# Altium footprint library Common Components.PcbLib: 94 footprints (part 4 of 6)
Each footprint in its own frame and in the unit in brackets; x right, y up, seen from the top. Pads: shape width x height; smd on the part's side, far side on the other; paste and mask are expansions set on the pad; w line width, h text height; cw(c..) or ccw(c..) is an arc to the next point about the centre after c.
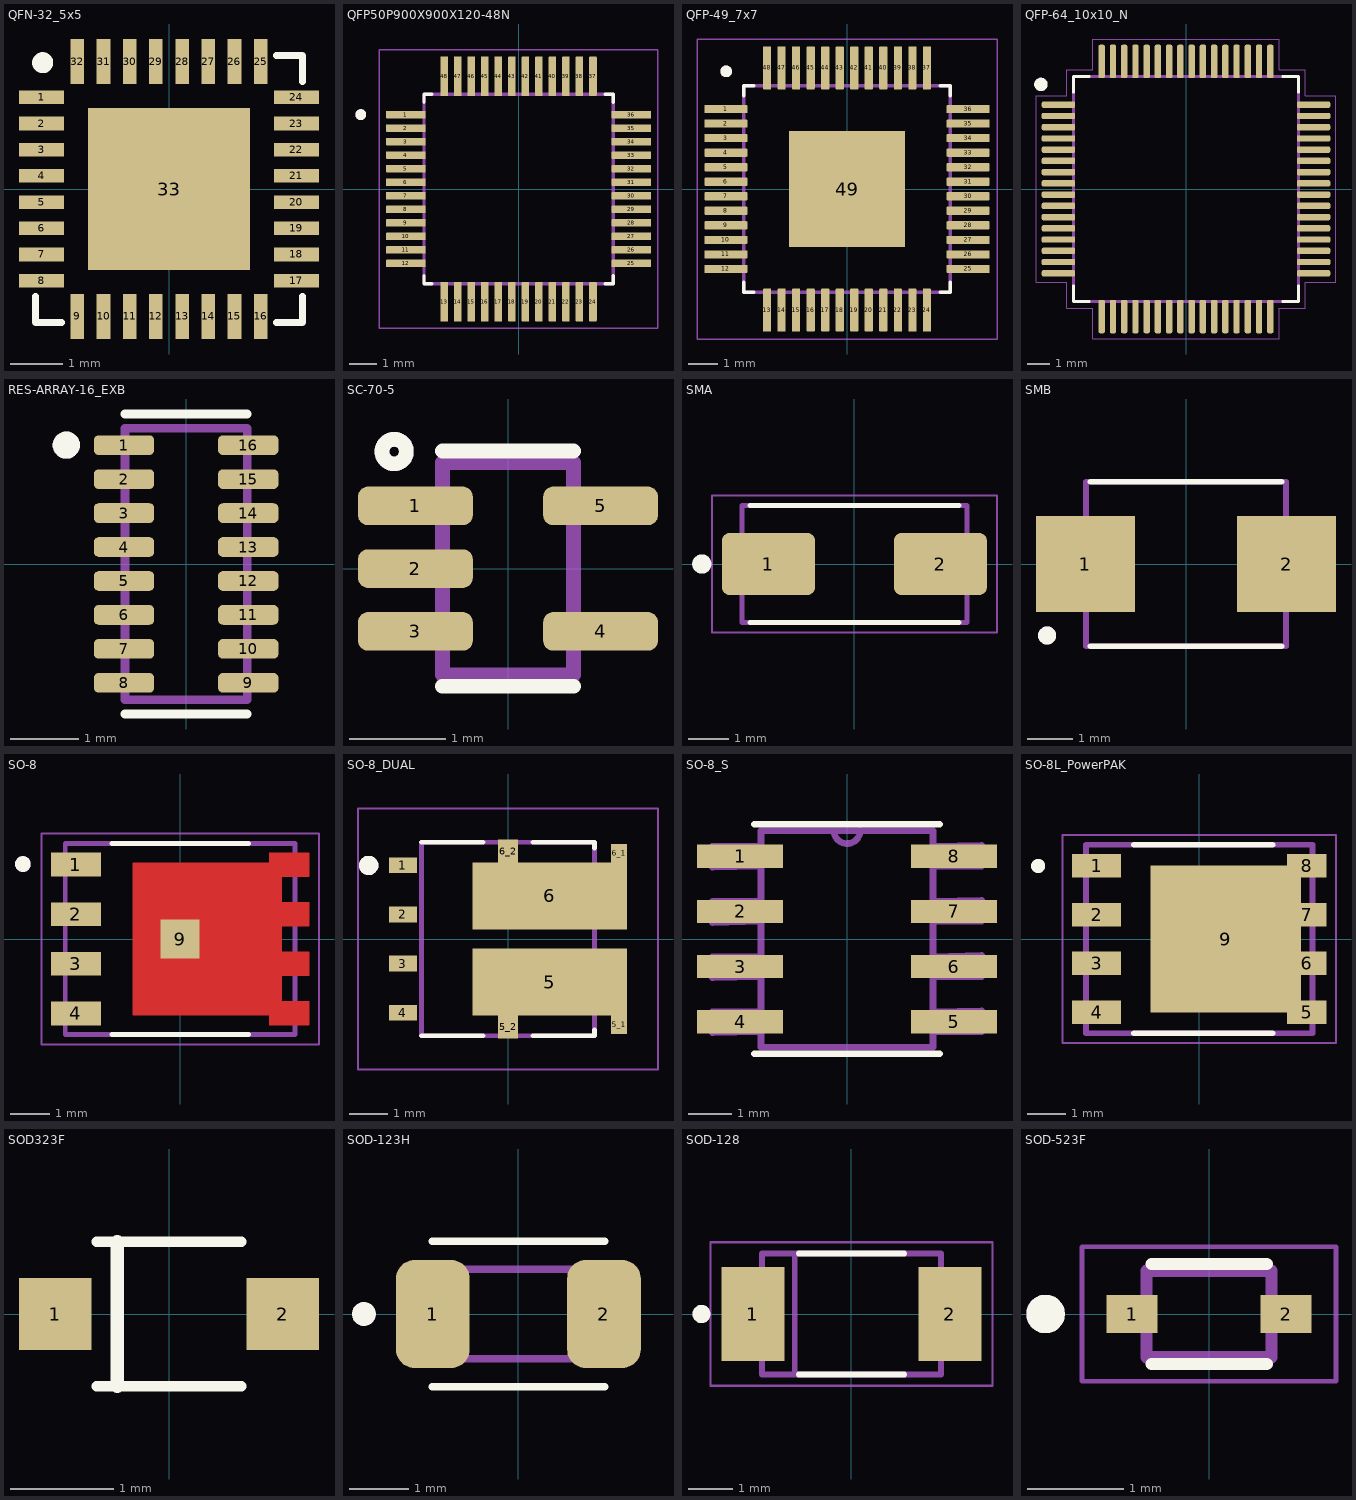
[diagram p3: the footprints below, top view; thin cyan lines are the x and y axes]

## QFN-32_5x5 [mm]
pads (33):
  rect 0.86x0.26 smd mask+0.051: 1(-2.435,1.75) 2(-2.435,1.25) 3(-2.435,0.75) 4(-2.435,0.25) 5(-2.435,-0.25) 6(-2.435,-0.75) 7(-2.435,-1.25) 8(-2.435,-1.75) 17(2.435,-1.75) 18(2.435,-1.25) 19(2.435,-0.75) 20(2.435,-0.25) 21(2.435,0.25) 22(2.435,0.75) 23(2.435,1.25) 24(2.435,1.75)
  rect 0.26x0.86 smd mask+0.051: 9(-1.75,-2.435) 10(-1.25,-2.435) 11(-0.75,-2.435) 12(-0.25,-2.435) 13(0.25,-2.435) 14(0.75,-2.435) 15(1.25,-2.435) 16(1.75,-2.435) 25(1.75,2.435) 26(1.25,2.435) 27(0.75,2.435) 28(0.25,2.435) 29(-0.25,2.435) 30(-0.75,2.435) 31(-1.25,2.435) 32(-1.75,2.435)
  rect 3.1x3.1 smd: 33(0,0)
Top Overlay:
  circle w0.2: c-2.413,2.413 r0.1
  lines w0.127: -2.55,-2.05 -2.55,-2.55 -2.05,-2.55 ; 2.05,-2.55 2.55,-2.55 2.55,-2.05 ; 2.05,2.55 2.55,2.55 2.55,2.05
Top Paste:
  region: -0.981,0.98 0.98,0.98 0.98,-0.981 -0.981,-0.981
3D body "QFN-32_5x5.step": height 0.8, standoff 0, extent -2.51,-2.51 2.51,2.51

## QFP50P900X900X120-48N [mm]
pads (48):
  rrect25% 1.47x0.28 smd: 1(-4.17,2.75) 2(-4.17,2.25) 3(-4.17,1.75) 4(-4.17,1.25) 5(-4.17,0.75) 6(-4.17,0.25) 7(-4.17,-0.25) 8(-4.17,-0.75) 9(-4.17,-1.25) 10(-4.17,-1.75) 11(-4.17,-2.25) 12(-4.17,-2.75) 25(4.17,-2.75) 26(4.17,-2.25) 27(4.17,-1.75) 28(4.17,-1.25) 29(4.17,-0.75) 30(4.17,-0.25) 31(4.17,0.25) 32(4.17,0.75) 33(4.17,1.25) 34(4.17,1.75) 35(4.17,2.25) 36(4.17,2.75)
  rrect25% 0.28x1.47 smd: 13(-2.75,-4.17) 14(-2.25,-4.17) 15(-1.75,-4.17) 16(-1.25,-4.17) 17(-0.75,-4.17) 18(-0.25,-4.17) 19(0.25,-4.17) 20(0.75,-4.17) 21(1.25,-4.17) 22(1.75,-4.17) 23(2.25,-4.17) 24(2.75,-4.17) 37(2.75,4.17) 38(2.25,4.17) 39(1.75,4.17) 40(1.25,4.17) 41(0.75,4.17) 42(0.25,4.17) 43(-0.25,4.17) 44(-0.75,4.17) 45(-1.25,4.17) 46(-1.75,4.17) 47(-2.25,4.17) 48(-2.75,4.17)
Top Overlay:
  circle w0.2: c-5.84,2.75 r0.1
  lines w0.127: -3.5,-3.21 -3.5,-3.5 -3.21,-3.5 ; -3.5,3.21 -3.5,3.5 -3.21,3.5 ; 3.21,-3.5 3.5,-3.5 3.5,-3.21 ; 3.21,3.5 3.5,3.5 3.5,3.21
Mechanical 13:
  circle w0.2: c-5.84,2.75 r0.1
  lines w0.127: -3.5,-3.5 3.5,-3.5 3.5,3.5 -3.5,3.5 -3.5,-3.5
Mechanical 15:
  lines w0.05: -5.155,-5.155 5.155,-5.155 5.155,5.155 -5.155,5.155 -5.155,-5.155
3D body "TQFP48.step": height 1.01, standoff -0.01, extent -4.5,-4.5 4.509,4.5

## QFP-49_7x7 [mm]
pads (49):
  rrect25% 1.49x0.28 smd: 1(-4.17,2.75) 2(-4.17,2.25) 3(-4.17,1.75) 4(-4.17,1.25) 5(-4.17,0.75) 6(-4.17,0.25) 7(-4.17,-0.25) 8(-4.17,-0.75) 9(-4.17,-1.25) 10(-4.17,-1.75) 11(-4.17,-2.25) 12(-4.17,-2.75) 25(4.17,-2.75) 26(4.17,-2.25) 27(4.17,-1.75) 28(4.17,-1.25) 29(4.17,-0.75) 30(4.17,-0.25) 31(4.17,0.25) 32(4.17,0.75) 33(4.17,1.25) 34(4.17,1.75) 35(4.17,2.25) 36(4.17,2.75)
  rrect25% 0.28x1.49 smd: 13(-2.75,-4.17) 14(-2.25,-4.17) 15(-1.75,-4.17) 16(-1.25,-4.17) 17(-0.75,-4.17) 18(-0.25,-4.17) 19(0.25,-4.17) 20(0.75,-4.17) 21(1.25,-4.17) 22(1.75,-4.17) 23(2.25,-4.17) 24(2.75,-4.17) 37(2.75,4.17) 38(2.25,4.17) 39(1.75,4.17) 40(1.25,4.17) 41(0.75,4.17) 42(0.25,4.17) 43(-0.25,4.17) 44(-0.75,4.17) 45(-1.25,4.17) 46(-1.75,4.17) 47(-2.25,4.17) 48(-2.75,4.17)
  rect 4x4 smd paste-3: 49(0,0)
Top Overlay:
  circle w0.2: c-4.16,4.05 r0.1
  lines w0.127: -3.55,-3.21 -3.55,-3.55 -3.21,-3.55 ; -3.55,3.21 -3.55,3.55 -3.21,3.55 ; 3.21,-3.55 3.55,-3.55 3.55,-3.21 ; 3.21,3.55 3.55,3.55 3.55,3.21
Top Paste:
  region: 1.63,-1.63 0.37,-1.63 0.37,-0.37 1.63,-0.37
  region: -0.37,-1.63 -1.63,-1.63 -1.63,-0.37 -0.37,-0.37
  region: 1.63,0.37 0.37,0.37 0.37,1.63 1.63,1.63
  region: -0.37,0.37 -1.63,0.37 -1.63,1.63 -0.37,1.63
Mechanical 13:
  circle w0.2: c-4.16,4.05 r0.1
  lines w0.127: -3.55,-3.55 -3.55,3.55 3.55,3.55 3.55,-3.55 -3.55,-3.55
Mechanical 15:
  lines w0.05: -5.165,-5.165 -5.165,5.165 5.165,5.165 5.165,-5.165 -5.165,-5.165
3D body "step_temp.STEP": height 1.18, standoff -0.02, extent -4.496,-4.5 4.504,4.5

## QFP-64_10x10_N [mm]
pads (64):
  rrect50% 1.49x0.28 smd: 1(-5.67,3.75) 2(-5.67,3.25) 3(-5.67,2.75) 4(-5.67,2.25) 5(-5.67,1.75) 6(-5.67,1.25) 7(-5.67,0.75) 8(-5.67,0.25) 9(-5.67,-0.25) 10(-5.67,-0.75) 11(-5.67,-1.25) 12(-5.67,-1.75) 13(-5.67,-2.25) 14(-5.67,-2.75) 15(-5.67,-3.25) 16(-5.67,-3.75) 33(5.67,-3.75) 34(5.67,-3.25) 35(5.67,-2.75) 36(5.67,-2.25) 37(5.67,-1.75) 38(5.67,-1.25) 39(5.67,-0.75) 40(5.67,-0.25) 41(5.67,0.25) 42(5.67,0.75) 43(5.67,1.25) 44(5.67,1.75) 45(5.67,2.25) 46(5.67,2.75) 47(5.67,3.25) 48(5.67,3.75)
  rrect50% 0.28x1.49 smd: 17(-3.75,-5.67) 18(-3.25,-5.67) 19(-2.75,-5.67) 20(-2.25,-5.67) 21(-1.75,-5.67) 22(-1.25,-5.67) 23(-0.75,-5.67) 24(-0.25,-5.67) 25(0.25,-5.67) 26(0.75,-5.67) 27(1.25,-5.67) 28(1.75,-5.67) 29(2.25,-5.67) 30(2.75,-5.67) 31(3.25,-5.67) 32(3.75,-5.67) 49(3.75,5.67) 50(3.25,5.67) 51(2.75,5.67) 52(2.25,5.67) 53(1.75,5.67) 54(1.25,5.67) 55(0.75,5.67) 56(0.25,5.67) 57(-0.25,5.67) 58(-0.75,5.67) 59(-1.25,5.67) 60(-1.75,5.67) 61(-2.25,5.67) 62(-2.75,5.67) 63(-3.25,5.67) 64(-3.75,5.67)
Top Overlay:
  circle w0.3: c-6.45,4.65 r0.15
  circle w0.3: c-6.45,4.65 r0.15
  circle w0.127: c-6.45,4.65 r0.05
  lines w0.127: -5,-4.3 -5,-5 -4.3,-5 ; -5,4.3 -5,5 -4.3,5 ; 4.3,-5 5,-5 5,-4.3 ; 4.3,5 5,5 5,4.3
Mechanical 13:
  lines w0.127: -5,-5 -5,5 5,5 5,-5 -5,-5
Mechanical 15:
  lines w0.05: -6.67,-4.14 -6.67,4.14 -5.3,4.14 -5.3,5.3 -4.14,5.3 -4.14,6.67 4.14,6.67 4.14,5.3 5.3,5.3 5.3,4.14 6.67,4.14 6.67,-4.14 5.3,-4.14 5.3,-5.3 4.14,-5.3 4.14,-6.67 -4.14,-6.67 -4.14,-5.3 -5.3,-5.3 -5.3,-4.14 -6.67,-4.14
3D body "QFP-64_10x10.STEP": height 1.57, standoff -0.03, extent -6,-6 6,6

## RES-ARRAY-16_EXB [mm]
pads (16):
  rrect50% 0.89x0.29 smd paste+0 mask+0.127: 1(-0.915,1.75) 2(-0.915,1.25) 3(-0.915,0.75) 4(-0.915,0.25) 5(-0.915,-0.25) 6(-0.915,-0.75) 7(-0.915,-1.25) 8(-0.915,-1.75) 9(0.915,-1.75) 10(0.915,-1.25) 11(0.915,-0.75) 12(0.915,-0.25) 13(0.915,0.25) 14(0.915,0.75) 15(0.915,1.25) 16(0.915,1.75)
Top Overlay:
  circle w0.2: c-1.765,1.75 r0.1
  lines w0.127: -0.9,-2.209 0.9,-2.209 ; -0.9,2.209 0.9,2.209
Mechanical 13:
  circle w0.2: c-1.765,1.75 r0.1
  lines w0.127: -0.9,-2 -0.9,2 0.9,2 0.9,-2 -0.9,-2
3D body "RES_ARRAY-16_EXB.STEP": height 0.55, standoff 0, extent -0.9,-1.95 0.9,1.95

## SC-70-5 [mm]
pads (5):
  rrect50% 1.19x0.4 smd mask+0.178: 1(-0.96,0.65) 2(-0.96,0) 3(-0.96,-0.65) 4(0.96,-0.65) 5(0.96,0.65)
Top Overlay:
  lines w0.152: -0.68,-1.219 0.68,-1.219 ; -0.68,1.219 0.68,1.219 ; -1.18,1.087 cw(c-1.18,1.214) -1.18,1.341 cw(c-1.18,1.214) -1.18,1.087
Mechanical 13:
  lines w0.152: -1.18,1.087 cw(c-1.18,1.214) -1.18,1.341 cw(c-1.18,1.214) -1.18,1.087 ; -0.68,-1.1 -0.68,1.1 0.68,1.1 0.68,-1.1 -0.68,-1.1
3D body "SC70-5.step": height 0.95, standoff 0, extent -1.05,-1 1.05,1

## SMA [mm]
pads (2):
  rrect25% 2.32x1.55 smd: 1(-2.14,0) 2(2.14,0)
Top Overlay:
  circle w0.24: c-3.8,0 r0.12
  lines w0.127: -2.605,-1.46 2.605,-1.46 ; -2.605,1.46 2.605,1.46
Mechanical 13:
  lines w0.127: -2.8,-1.46 2.8,-1.46 2.8,1.46 -2.8,1.46 -2.8,-1.46
Mechanical 15:
  lines w0.05: -3.55,-1.71 -3.55,1.71 3.55,1.71 3.55,-1.71 -3.55,-1.71
3D body "SMA.step": height 2.15, standoff -0.05, extent -2.5,-1.35 2.5,1.35

## SMB [mm]
pads (2):
  rect 2.18x2.12 smd: 1(-2.215,0) 2(2.215,0)
Top Overlay:
  circle w0.2: c-3.061,-1.575 r0.1
  lines w0.127: -2.103,-1.81 2.103,-1.81 ; -2.103,1.81 2.103,1.81
Mechanical 13:
  circle w0.2: c-3.061,-1.575 r0.1
  lines w0.127: -2.203,-1.81 2.203,-1.81 2.203,1.81 -2.203,1.81 -2.203,-1.81
3D body "SMB.step": height 2.45, standoff 0.03, extent -2.75,-1.95 2.75,1.95

## SO-8 [mm]
pads (5):
  rect 1.27x0.61 smd: 1(-2.67,1.905) 2(-2.67,0.635) 3(-2.67,-0.635) 4(-2.67,-1.905)
  rect 1x1 smd paste-1 mask+0: 9(0,0)
Top Layer:
  region: 3.305,1.6 2.595,1.6 2.595,0.94 3.305,0.94 3.305,0.33 2.595,0.33 2.595,-0.33 3.305,-0.33 3.305,-0.94 2.595,-0.94 2.595,-1.6 3.305,-1.6 3.305,-2.21 2.285,-2.21 2.285,-1.955 -1.215,-1.955 -1.215,1.955 2.285,1.955 2.285,2.21 3.305,2.21
Top Overlay:
  circle w0.2: c-4.03,1.92 r0.1
  lines w0.127: -1.75,-2.45 1.75,-2.45 ; -1.75,2.45 1.75,2.45
Top Paste:
  region: 1.895,-1.236 -0.515,-1.236 -0.515,1.236 1.895,1.236
  region: 3.305,1.6 2.285,1.6 2.285,2.21 3.305,2.21
  region: 3.305,0.33 2.285,0.33 2.285,0.94 3.305,0.94
  region: 3.305,-0.94 2.285,-0.94 2.285,-0.33 3.305,-0.33
  region: 3.305,-2.21 2.285,-2.21 2.285,-1.6 3.305,-1.6
Top Solder:
  region: 3.405,1.5 2.695,1.5 2.695,1.04 3.405,1.04 3.405,0.23 2.695,0.23 2.695,-0.23 3.405,-0.23 3.405,-1.04 2.695,-1.04 2.695,-1.5 3.405,-1.5 3.405,-2.31 2.185,-2.31 2.185,-2.055 -1.315,-2.055 -1.315,2.055 2.185,2.055 2.185,2.31 3.405,2.31
Mechanical 13:
  circle w0.2: c-4.03,1.92 r0.1
  lines w0.127: -2.945,-2.45 -2.945,2.45 2.945,2.45 2.945,-2.45 -2.945,-2.45
Mechanical 15:
  lines w0.05: -3.555,-2.7 -3.555,2.7 3.555,2.7 3.555,-2.7 -3.555,-2.7
3D body "SO-8.STEP": height 1.13, standoff 0, extent -3.094,-2.575 3.056,2.575

## SO-8_DUAL [mm]
pads (10):
  rect 0.72x0.41 smd: 1(-2.715,1.905) 2(-2.715,0.635) 3(-2.715,-0.635) 4(-2.715,-1.905)
  rect 3.99x1.73 smd: 5(1.08,-1.115) 6(1.08,1.115)
  rect 0.41x0.47 smd: 5_1(2.87,-2.215) 6_1(2.87,2.215)
  rect 0.51x0.585 smd: 5_2(0,-2.272) 6_2(0,2.272)
Top Overlay:
  circle w0.3: c-3.6,1.9 r0.1
  lines w0.127: -2.235,-2.5 -0.65,-2.5 ; -2.235,2.5 -0.65,2.5 ; 0.65,-2.5 2.235,-2.5 2.235,-2.35 ; 0.65,2.5 2.235,2.5 2.235,2.35
Mechanical 13:
  circle w0.3: c-3.6,1.9 r0.1
  lines w0.127: -2.235,-2.5 2.235,-2.5 2.235,2.5 -2.235,2.5 -2.235,-2.5
Mechanical 15:
  lines w0.05: -3.875,-3.375 3.875,-3.375 3.875,3.375 -3.875,3.375 -3.875,-3.375
3D body "SO-8_DUAL.STEP": height 1.13, standoff 0.01, extent -3.073,-2.578 3.073,2.578

## SO-8_S [mil]
pads (8):
  rect 78x21 smd: 1(-97,75) 2(-97,25) 3(-97,-25) 4(-97,-75) 5(97,-75) 6(97,-25) 7(97,25) 8(97,75)
Top Overlay:
  lines w6: -84,-104 84,-104 ; -84,104 84,104
Mechanical 13:
  lines w6: -12,98.08 ccw(c0,98.5) 12,98.92 ; -122,-85 -122,-66 -78,-66 -78,-84 -122,-85 ; -122,-35 -122,-16 -78,-16 -78,-34 -122,-35 ; -122,15 -122,34 -78,34 -78,16 -122,15 ; -122,65 -122,84 -78,84 -78,66 -122,65 ; -78,-98 78,-98 78,98 -12,98 -78,98 -78,-98 ; 78,-84 78,-66 122,-65 122,-84 78,-84 ; 78,-34 78,-16 122,-15 122,-34 78,-34 ; 78,16 78,34 122,35 122,16 78,16 ; 78,66 78,84 122,85 122,66 78,66
3D body "SO-8_S.step": height 57.5, standoff 0.5, extent -113.75,-97 113.75,96

## SO-8L_PowerPAK [mm]
pads (9):
  rect 1.27x0.61 smd: 1(-2.67,1.905) 2(-2.67,0.635) 3(-2.67,-0.635) 4(-2.67,-1.905)
  rect 1.02x0.61 smd: 5(2.795,-1.905) 6(2.795,-0.635) 7(2.795,0.635) 8(2.795,1.905)
  rect 3.91x3.81 smd paste-3: 9(0.69,0)
Top Overlay:
  circle w0.254: c-4.19,1.9 r0.056
  lines w0.152: -1.7,-2.45 1.9,-2.45 ; -1.7,2.45 1.9,2.45
Top Paste:
  region: 2.03,-1.38 -0.65,-1.38 -0.65,1.38 2.03,1.38
Mechanical 13:
  circle w0.254: c-4.19,1.9 r0.056
  lines w0.152: -2.945,-2.45 -2.945,2.45 2.945,2.45 2.945,-2.45 -2.945,-2.45
Mechanical 15:
  lines w0.05: -3.555,-2.7 3.555,-2.7 3.555,2.7 -3.555,2.7 -3.555,-2.7
3D body "SO-8L-PowerPAK.STEP": height 1.08, standoff 0.01, extent -3.055,-2.56 3.095,2.56

## SOD323F [mm]
pads (2):
  rect 0.7x0.7 smd: 1(-1.1,0) 2(1.1,0)
Top Overlay:
  lines w0.1: -0.7,-0.7 0.7,-0.7 ; -0.7,0.7 -0.5,0.7 0.7,0.7
  lines w0.127: -0.5,-0.7 -0.5,0.7

## SOD-123H [mm]
pads (2):
  rrect50% 1.24x1.82 smd: 1(-1.44,0) 2(1.44,0)
Top Overlay:
  circle w0.2: c-2.6,0 r0.1
  lines w0.127: -1.45,-1.225 1.45,-1.225 ; -1.45,1.225 1.45,1.225
Mechanical 13:
  circle w0.2: c-2.6,0 r0.1
  lines w0.127: -1.5,-0.75 -1.5,0.75 1.5,0.75 1.5,-0.75 -1.5,-0.75
3D body "SOD-123.step": height 1.18, standoff 0, extent -1.95,-0.9 1.95,0.9

## SOD-128 [mm]
pads (2):
  rect 1.4x2.1 smd: 1(-2.2,0) 2(2.2,0)
Top Overlay:
  circle w0.2: c-3.35,0 r0.1
  lines w0.127: -1.18,-1.35 1.18,-1.35 ; -1.18,1.35 1.18,1.35
Top Paste:
  region: -2.8,0.95 -1.6,0.95 -1.6,-0.95 -2.8,-0.95
  region: 1.6,0.95 2.8,0.95 2.8,-0.95 1.6,-0.95
Mechanical 13:
  circle w0.2: c-3.35,0 r0.1
  circle w0.2: c-3.35,0 r0.1
  lines w0.127: -2,-1.35 -2,1.35 ; -2,-1.35 2,-1.35 ; -2,-1.35 -2,1.35 ; -2,-1.35 2,-1.35 ; -2,1.35 2,1.35 ; -2,1.35 2,1.35 ; 2,-1.35 2,1.35 ; 2,-1.35 2,1.35 ; -1.27,-1.27 -1.27,1.27 -1.27,-1.27
Mechanical 15:
  lines w0.05: -3.15,-1.6 -3.15,1.6 3.15,1.6 3.15,-1.6 -3.15,-1.6
3D body "SOD-128.step": height 1.12, standoff 0.01, extent -2.5,-1.35 2.5,1.35

## SOD-523F [mm]
pads (2):
  rect 0.53x0.4 smd: 1(-0.8,0) 2(0.8,0)
Top Overlay:
  circle w0.2: c-1.7,0 r0.1
  lines w0.127: -0.6,-0.52 0.6,-0.52 ; -0.6,0.52 0.6,0.52
Mechanical 13:
  circle w0.2: c-1.7,0 r0.1
  lines w0.127: -0.65,-0.45 0.65,-0.45 0.65,0.45 -0.65,0.45 -0.65,-0.45
Mechanical 15:
  lines w0.05: -1.32,-0.7 1.32,-0.7 1.32,0.7 -1.32,0.7 -1.32,-0.7
3D body "SOD-523F.step": height 0.7, standoff 0, extent -0.85,-0.45 0.85,0.45